# Altium schematic symbol library TI - ADC.SchLib: 2197 symbols (part 120 of 130) (continued)
## TLV1570CDWG4
designator U?
10-Bit, 1.25 MSPS ADC 8-Channel, DSP / (Q)SPI IF, Programmable Internal Reference, Auto or Software Power Down, Very Low Power, 0 to 70 degC, 20-pin SOIC (DW20), Green (RoHS & no Sb/Br); Manufacturer: Texas Instruments; PartNumber: TLV1570CDWG4; # Input Channels: 8; Analog Voltage AV/DD(Max)(V): 5.5; Analog Voltage AV/DD(Min)(V): 2.7; Architecture: SAR; ENOB(Bits): 9.3; INL(Max)(+/-LSB): 1; Interface: Serial SPI; Resolution(Bits): 10; Sample Rate (max)(SPS): 1.25M; SFDR(dB): 63; SINAD(dB): 58; SNR(dB): 61; SubFamily: Precision ADC (<=10MSPS); DatasheetVersion: SLAS169B; PackageVersion: 4040000-4/G, 01/2011; PackageReference: DW20; PackageDescription: 20-Pin Plastic Small Outline, Body 12.8 x 7.5 mm, Pitch 1.27 mm; Supplier 1: Digi-Key; Supplier Part Number 1: ADS8331IPWR-ND; Supplier 2: Mouser; Supplier Part Number 2: 595-ADS8331IPWR; Digital Supply(Max)(V): 5.5; Digital Supply(Min)(V): 2.7; Eco-Plan: Green (RoHS & no Sb/Br); Mounting Technology: Surface Mount; Code_JEDEC: MO-013; ComponentLink1Description: Manufacturer URL; ComponentLink1URL: http://www.ti.com/; ComponentLink2Description: Datasheet; ComponentLink2URL: http://www.ti.com/general/docs/lit/getliterature.tsp?genericPartNumber=TLV1570&fileType=pdf; ComponentLink3Description: Package Specification; ComponentLink3URL: http://www.ti.com/lit/ml/mpds173a/mpds173a.pdf
footprint TI-DW20_N (SOIC, 20-Leads, Body 12.8x7.5mm, Pitch 1.27mm, IPC Medium Density)
footprint TI-DW20_L (SOIC, 20-Leads, Body 12.8x7.5mm, Pitch 1.27mm, IPC High Density)
footprint TI-DW20_M (SOIC, 20-Leads, Body 12.8x7.5mm, Pitch 1.27mm, IPC Low Density)
pins: 1 CH4 (in) "Analog input channels 0 - 7", 2 CH3 (in) "Analog input channels 0 - 7", 3 CH2 (in) "Analog input channels 0 - 7", 4 CH1 (in) "Analog input channels 0 - 7", 5 CH0 (in) "Analog input channels 0 - 7", 6 DVDD (power) "Digital supply voltage, 2.7 V to 5.5 V", 7 DGND (power) "Digital ground", 8 FS (in) "Frame sync. The falling edge of the frame sync pulse from a DSP indicates the start of a serial data frame shifted out of the TLV1570. FS is pulled high when interfaced to a microcontroller.", 9 SCLK (in) "Serial clock input. SCLK synchronizes the serial data transfer and is also used for internal data conversion.", 10 SDIN (in) "Serial data input used to configure the internal control register.", 11 SDOUT (out) "Serial data output. A/D conversion results are output at SDOUT.", 12 ~{CS} (in) "Chip select. A low level signal on C\S\ enables the TLV1570. A high level signal on C\S\ disables the device and disconnects power to the TLV1570.", 13 REF (in) "Reference voltage input. The voltage applied to REF defines the input span of the TLV1570. In external reference mode, a 0.1 uF decoupling capacitor must be placed between the reference and AGND. This is not required for (See Datasheet)", 14 AGND (power) "Analog ground", 15 AVDD (power) "Analog supply voltage, 2.7 V to 5.5 V", 16 CH7 (in) "Analog input channels 0 - 7", 17 CH6 (in) "Analog input channels 0 - 7", 18 CH5 (in) "Analog input channels 0 - 7", 19 MO (out) "On-chip MUX analog output", 20 AIN (in) "ADC analog input"

## TLV1570CDWR
designator U?
10-Bit, 1.25 MSPS ADC 8-Channel, DSP / (Q)SPI IF, Programmable Internal Reference, Auto or Software Power Down, Very Low Power, 0 to 70 degC, 20-pin SOIC (DW20), Green (RoHS & no Sb/Br); Manufacturer: Texas Instruments; PartNumber: TLV1570CDWR; # Input Channels: 8; Analog Voltage AV/DD(Max)(V): 5.5; Analog Voltage AV/DD(Min)(V): 2.7; Architecture: SAR; ENOB(Bits): 9.3; INL(Max)(+/-LSB): 1; Interface: Serial SPI; Resolution(Bits): 10; Sample Rate (max)(SPS): 1.25M; SFDR(dB): 63; SINAD(dB): 58; SNR(dB): 61; SubFamily: Precision ADC (<=10MSPS); DatasheetVersion: SLAS169B; PackageVersion: 4040000-4/G, 01/2011; PackageReference: DW20; PackageDescription: 20-Pin Plastic Small Outline, Body 12.8 x 7.5 mm, Pitch 1.27 mm; Supplier 1: Digi-Key; Supplier Part Number 1: 296-25861-2-ND; Supplier 2: Digi-Key; Supplier Part Number 2: 296-25861-1-ND; Supplier 3: Digi-Key; Supplier Part Number 3: 296-25861-6-ND; Supplier 4: Mouser; Supplier Part Number 4: 595-ADS8331IRGER; Digital Supply(Max)(V): 5.5; Digital Supply(Min)(V): 2.7; Eco-Plan: Green (RoHS & no Sb/Br); Mounting Technology: Surface Mount; Code_JEDEC: MO-013; ComponentLink1Description: Manufacturer URL; ComponentLink1URL: http://www.ti.com/; ComponentLink2Description: Datasheet; ComponentLink2URL: http://www.ti.com/general/docs/lit/getliterature.tsp?genericPartNumber=TLV1570&fileType=pdf; ComponentLink3Description: Package Specification; ComponentLink3URL: http://www.ti.com/lit/ml/mpds173a/mpds173a.pdf
footprint TI-DW20_N (SOIC, 20-Leads, Body 12.8x7.5mm, Pitch 1.27mm, IPC Medium Density)
footprint TI-DW20_L (SOIC, 20-Leads, Body 12.8x7.5mm, Pitch 1.27mm, IPC High Density)
footprint TI-DW20_M (SOIC, 20-Leads, Body 12.8x7.5mm, Pitch 1.27mm, IPC Low Density)
pins: 1 CH4 (in) "Analog input channels 0 - 7", 2 CH3 (in) "Analog input channels 0 - 7", 3 CH2 (in) "Analog input channels 0 - 7", 4 CH1 (in) "Analog input channels 0 - 7", 5 CH0 (in) "Analog input channels 0 - 7", 6 DVDD (power) "Digital supply voltage, 2.7 V to 5.5 V", 7 DGND (power) "Digital ground", 8 FS (in) "Frame sync. The falling edge of the frame sync pulse from a DSP indicates the start of a serial data frame shifted out of the TLV1570. FS is pulled high when interfaced to a microcontroller.", 9 SCLK (in) "Serial clock input. SCLK synchronizes the serial data transfer and is also used for internal data conversion.", 10 SDIN (in) "Serial data input used to configure the internal control register.", 11 SDOUT (out) "Serial data output. A/D conversion results are output at SDOUT.", 12 ~{CS} (in) "Chip select. A low level signal on C\S\ enables the TLV1570. A high level signal on C\S\ disables the device and disconnects power to the TLV1570.", 13 REF (in) "Reference voltage input. The voltage applied to REF defines the input span of the TLV1570. In external reference mode, a 0.1 uF decoupling capacitor must be placed between the reference and AGND. This is not required for (See Datasheet)", 14 AGND (power) "Analog ground", 15 AVDD (power) "Analog supply voltage, 2.7 V to 5.5 V", 16 CH7 (in) "Analog input channels 0 - 7", 17 CH6 (in) "Analog input channels 0 - 7", 18 CH5 (in) "Analog input channels 0 - 7", 19 MO (out) "On-chip MUX analog output", 20 AIN (in) "ADC analog input"

## TLV1570CDWRG4
designator U?
10-Bit, 1.25 MSPS ADC 8-Channel, DSP / (Q)SPI IF, Programmable Internal Reference, Auto or Software Power Down, Very Low Power, 0 to 70 degC, 20-pin SOIC (DW20), Green (RoHS & no Sb/Br); Manufacturer: Texas Instruments; PartNumber: TLV1570CDWRG4; # Input Channels: 8; Analog Voltage AV/DD(Max)(V): 5.5; Analog Voltage AV/DD(Min)(V): 2.7; Architecture: SAR; ENOB(Bits): 9.3; INL(Max)(+/-LSB): 1; Interface: Serial SPI; Resolution(Bits): 10; Sample Rate (max)(SPS): 1.25M; SFDR(dB): 63; SINAD(dB): 58; SNR(dB): 61; SubFamily: Precision ADC (<=10MSPS); DatasheetVersion: SLAS169B; PackageVersion: 4040000-4/G, 01/2011; PackageReference: DW20; PackageDescription: 20-Pin Plastic Small Outline, Body 12.8 x 7.5 mm, Pitch 1.27 mm; Supplier 1: Digi-Key; Supplier Part Number 1: 296-25862-2-ND; Supplier 2: Digi-Key; Supplier Part Number 2: 296-25862-1-ND; Supplier 3: Digi-Key; Supplier Part Number 3: 296-25862-6-ND; Supplier 4: Farnell; Supplier Part Number 4: 1815712; Supplier 5: Newark; Supplier Part Number 5: 67R1111; Supplier 6: Mouser; Supplier Part Number 6: 595-ADS8331IRGET; Digital Supply(Max)(V): 5.5; Digital Supply(Min)(V): 2.7; Eco-Plan: Green (RoHS & no Sb/Br); Mounting Technology: Surface Mount; Code_JEDEC: MO-013; ComponentLink1Description: Manufacturer URL; ComponentLink1URL: http://www.ti.com/; ComponentLink2Description: Datasheet; ComponentLink2URL: http://www.ti.com/general/docs/lit/getliterature.tsp?genericPartNumber=TLV1570&fileType=pdf; ComponentLink3Description: Package Specification; ComponentLink3URL: http://www.ti.com/lit/ml/mpds173a/mpds173a.pdf
footprint TI-DW20_N (SOIC, 20-Leads, Body 12.8x7.5mm, Pitch 1.27mm, IPC Medium Density)
footprint TI-DW20_L (SOIC, 20-Leads, Body 12.8x7.5mm, Pitch 1.27mm, IPC High Density)
footprint TI-DW20_M (SOIC, 20-Leads, Body 12.8x7.5mm, Pitch 1.27mm, IPC Low Density)
pins: 1 CH4 (in) "Analog input channels 0 - 7", 2 CH3 (in) "Analog input channels 0 - 7", 3 CH2 (in) "Analog input channels 0 - 7", 4 CH1 (in) "Analog input channels 0 - 7", 5 CH0 (in) "Analog input channels 0 - 7", 6 DVDD (power) "Digital supply voltage, 2.7 V to 5.5 V", 7 DGND (power) "Digital ground", 8 FS (in) "Frame sync. The falling edge of the frame sync pulse from a DSP indicates the start of a serial data frame shifted out of the TLV1570. FS is pulled high when interfaced to a microcontroller.", 9 SCLK (in) "Serial clock input. SCLK synchronizes the serial data transfer and is also used for internal data conversion.", 10 SDIN (in) "Serial data input used to configure the internal control register.", 11 SDOUT (out) "Serial data output. A/D conversion results are output at SDOUT.", 12 ~{CS} (in) "Chip select. A low level signal on C\S\ enables the TLV1570. A high level signal on C\S\ disables the device and disconnects power to the TLV1570.", 13 REF (in) "Reference voltage input. The voltage applied to REF defines the input span of the TLV1570. In external reference mode, a 0.1 uF decoupling capacitor must be placed between the reference and AGND. This is not required for (See Datasheet)", 14 AGND (power) "Analog ground", 15 AVDD (power) "Analog supply voltage, 2.7 V to 5.5 V", 16 CH7 (in) "Analog input channels 0 - 7", 17 CH6 (in) "Analog input channels 0 - 7", 18 CH5 (in) "Analog input channels 0 - 7", 19 MO (out) "On-chip MUX analog output", 20 AIN (in) "ADC analog input"

## TLV1570CPW
designator U?
10-Bit, 1.25 MSPS ADC 8-Channel, DSP / (Q)SPI IF, Programmable Internal Reference, Auto or Software Power Down, Very Low Power, 0 to 70 degC, 20-pin SOP (PW20), Green (RoHS & no Sb/Br); Manufacturer: Texas Instruments; PartNumber: TLV1570CPW; # Input Channels: 8; Analog Voltage AV/DD(Max)(V): 5.5; Analog Voltage AV/DD(Min)(V): 2.7; Architecture: SAR; ENOB(Bits): 9.3; INL(Max)(+/-LSB): 1; Interface: Serial SPI; Resolution(Bits): 10; Sample Rate (max)(SPS): 1.25M; SFDR(dB): 63; SINAD(dB): 58; SNR(dB): 61; SubFamily: Precision ADC (<=10MSPS); DatasheetVersion: SLAS169B; PackageVersion: 4040064-5/G, 02/2011; PackageReference: PW20; PackageDescription: 20-Pin Plastic Small Outline, Body 6.5 x 4.4 mm, Pitch 0.65 mm; Supplier 1: Digi-Key; Supplier Part Number 1: ADS7263SRHBR-ND; Supplier 2: Mouser; Supplier Part Number 2: 595-ADS7263SRHBR; Digital Supply(Max)(V): 5.5; Digital Supply(Min)(V): 2.7; Eco-Plan: Green (RoHS & no Sb/Br); Mounting Technology: Surface Mount; Code_JEDEC: MO-153; ComponentLink1Description: Manufacturer URL; ComponentLink1URL: http://www.ti.com/; ComponentLink2Description: Datasheet; ComponentLink2URL: http://www.ti.com/general/docs/lit/getliterature.tsp?genericPartNumber=TLV1570&fileType=pdf; ComponentLink3Description: Package Specification; ComponentLink3URL: http://www.ti.com.cn/cn/lit/ml/mpds362/mpds362.pdf
footprint TI-PW20_N (SOP, 20-Leads, Body 6.5x4.4mm, Pitch 0.65mm, IPC Medium Density)
footprint TI-PW20_L (SOP, 20-Leads, Body 6.5x4.4mm, Pitch 0.65mm, IPC High Density)
footprint TI-PW20_M (SOP, 20-Leads, Body 6.5x4.4mm, Pitch 0.65mm, IPC Low Density)
pins: 1 CH4 (in) "Analog input channels 0 - 7", 2 CH3 (in) "Analog input channels 0 - 7", 3 CH2 (in) "Analog input channels 0 - 7", 4 CH1 (in) "Analog input channels 0 - 7", 5 CH0 (in) "Analog input channels 0 - 7", 6 DVDD (power) "Digital supply voltage, 2.7 V to 5.5 V", 7 DGND (power) "Digital ground", 8 FS (in) "Frame sync. The falling edge of the frame sync pulse from a DSP indicates the start of a serial data frame shifted out of the TLV1570. FS is pulled high when interfaced to a microcontroller.", 9 SCLK (in) "Serial clock input. SCLK synchronizes the serial data transfer and is also used for internal data conversion.", 10 SDIN (in) "Serial data input used to configure the internal control register.", 11 SDOUT (out) "Serial data output. A/D conversion results are output at SDOUT.", 12 ~{CS} (in) "Chip select. A low level signal on C\S\ enables the TLV1570. A high level signal on C\S\ disables the device and disconnects power to the TLV1570.", 13 REF (in) "Reference voltage input. The voltage applied to REF defines the input span of the TLV1570. In external reference mode, a 0.1 uF decoupling capacitor must be placed between the reference and AGND. This is not required for (See Datasheet)", 14 AGND (power) "Analog ground", 15 AVDD (power) "Analog supply voltage, 2.7 V to 5.5 V", 16 CH7 (in) "Analog input channels 0 - 7", 17 CH6 (in) "Analog input channels 0 - 7", 18 CH5 (in) "Analog input channels 0 - 7", 19 MO (out) "On-chip MUX analog output", 20 AIN (in) "ADC analog input"

## TLV1570CPWG4
designator U?
10-Bit, 1.25 MSPS ADC 8-Channel, DSP / (Q)SPI IF, Programmable Internal Reference, Auto or Software Power Down, Very Low Power, 0 to 70 degC, 20-pin SOP (PW20), Green (RoHS & no Sb/Br); Manufacturer: Texas Instruments; PartNumber: TLV1570CPWG4; # Input Channels: 8; Analog Voltage AV/DD(Max)(V): 5.5; Analog Voltage AV/DD(Min)(V): 2.7; Architecture: SAR; ENOB(Bits): 9.3; INL(Max)(+/-LSB): 1; Interface: Serial SPI; Resolution(Bits): 10; Sample Rate (max)(SPS): 1.25M; SFDR(dB): 63; SINAD(dB): 58; SNR(dB): 61; SubFamily: Precision ADC (<=10MSPS); DatasheetVersion: SLAS169B; PackageVersion: 4040064-5/G, 02/2011; PackageReference: PW20; PackageDescription: 20-Pin Plastic Small Outline, Body 6.5 x 4.4 mm, Pitch 0.65 mm; Supplier 1: Digi-Key; Supplier Part Number 1: 296-28187-2-ND; Supplier 2: Digi-Key; Supplier Part Number 2: 296-28187-1-ND; Supplier 3: Digi-Key; Supplier Part Number 3: 296-28187-6-ND; Supplier 4: Farnell; Supplier Part Number 4: 1864809; Supplier 5: Newark; Supplier Part Number 5: 25T0986; Supplier 6: Mouser; Supplier Part Number 6: 595-ADS7263SRHBT; Digital Supply(Max)(V): 5.5; Digital Supply(Min)(V): 2.7; Eco-Plan: Green (RoHS & no Sb/Br); Mounting Technology: Surface Mount; Code_JEDEC: MO-153; ComponentLink1Description: Manufacturer URL; ComponentLink1URL: http://www.ti.com/; ComponentLink2Description: Datasheet; ComponentLink2URL: http://www.ti.com/general/docs/lit/getliterature.tsp?genericPartNumber=TLV1570&fileType=pdf; ComponentLink3Description: Package Specification; ComponentLink3URL: http://www.ti.com.cn/cn/lit/ml/mpds362/mpds362.pdf
footprint TI-PW20_N (SOP, 20-Leads, Body 6.5x4.4mm, Pitch 0.65mm, IPC Medium Density)
footprint TI-PW20_L (SOP, 20-Leads, Body 6.5x4.4mm, Pitch 0.65mm, IPC High Density)
footprint TI-PW20_M (SOP, 20-Leads, Body 6.5x4.4mm, Pitch 0.65mm, IPC Low Density)
pins: 1 CH4 (in) "Analog input channels 0 - 7", 2 CH3 (in) "Analog input channels 0 - 7", 3 CH2 (in) "Analog input channels 0 - 7", 4 CH1 (in) "Analog input channels 0 - 7", 5 CH0 (in) "Analog input channels 0 - 7", 6 DVDD (power) "Digital supply voltage, 2.7 V to 5.5 V", 7 DGND (power) "Digital ground", 8 FS (in) "Frame sync. The falling edge of the frame sync pulse from a DSP indicates the start of a serial data frame shifted out of the TLV1570. FS is pulled high when interfaced to a microcontroller.", 9 SCLK (in) "Serial clock input. SCLK synchronizes the serial data transfer and is also used for internal data conversion.", 10 SDIN (in) "Serial data input used to configure the internal control register.", 11 SDOUT (out) "Serial data output. A/D conversion results are output at SDOUT.", 12 ~{CS} (in) "Chip select. A low level signal on C\S\ enables the TLV1570. A high level signal on C\S\ disables the device and disconnects power to the TLV1570.", 13 REF (in) "Reference voltage input. The voltage applied to REF defines the input span of the TLV1570. In external reference mode, a 0.1 uF decoupling capacitor must be placed between the reference and AGND. This is not required for (See Datasheet)", 14 AGND (power) "Analog ground", 15 AVDD (power) "Analog supply voltage, 2.7 V to 5.5 V", 16 CH7 (in) "Analog input channels 0 - 7", 17 CH6 (in) "Analog input channels 0 - 7", 18 CH5 (in) "Analog input channels 0 - 7", 19 MO (out) "On-chip MUX analog output", 20 AIN (in) "ADC analog input"

## TLV1570CPWR
designator U?
10-Bit, 1.25 MSPS ADC 8-Channel, DSP / (Q)SPI IF, Programmable Internal Reference, Auto or Software Power Down, Very Low Power, 0 to 70 degC, 20-pin SOP (PW20), Green (RoHS & no Sb/Br); Manufacturer: Texas Instruments; PartNumber: TLV1570CPWR; # Input Channels: 8; Analog Voltage AV/DD(Max)(V): 5.5; Analog Voltage AV/DD(Min)(V): 2.7; Architecture: SAR; ENOB(Bits): 9.3; INL(Max)(+/-LSB): 1; Interface: Serial SPI; Resolution(Bits): 10; Sample Rate (max)(SPS): 1.25M; SFDR(dB): 63; SINAD(dB): 58; SNR(dB): 61; SubFamily: Precision ADC (<=10MSPS); DatasheetVersion: SLAS169B; PackageVersion: 4040064-5/G, 02/2011; PackageReference: PW20; PackageDescription: 20-Pin Plastic Small Outline, Body 6.5 x 4.4 mm, Pitch 0.65 mm; Supplier 1: Digi-Key; Supplier Part Number 1: 296-28267-5-ND; Supplier 2: Farnell; Supplier Part Number 2: 1882256; Supplier 3: Newark; Supplier Part Number 3: 27T6167; Supplier 4: Mouser; Supplier Part Number 4: 595-ADS8332IBPW; Digital Supply(Max)(V): 5.5; Digital Supply(Min)(V): 2.7; Eco-Plan: Green (RoHS & no Sb/Br); Mounting Technology: Surface Mount; Code_JEDEC: MO-153; ComponentLink1Description: Manufacturer URL; ComponentLink1URL: http://www.ti.com/; ComponentLink2Description: Datasheet; ComponentLink2URL: http://www.ti.com/general/docs/lit/getliterature.tsp?genericPartNumber=TLV1570&fileType=pdf; ComponentLink3Description: Package Specification; ComponentLink3URL: http://www.ti.com.cn/cn/lit/ml/mpds362/mpds362.pdf
footprint TI-PW20_N (SOP, 20-Leads, Body 6.5x4.4mm, Pitch 0.65mm, IPC Medium Density)
footprint TI-PW20_L (SOP, 20-Leads, Body 6.5x4.4mm, Pitch 0.65mm, IPC High Density)
footprint TI-PW20_M (SOP, 20-Leads, Body 6.5x4.4mm, Pitch 0.65mm, IPC Low Density)
pins: 1 CH4 (in) "Analog input channels 0 - 7", 2 CH3 (in) "Analog input channels 0 - 7", 3 CH2 (in) "Analog input channels 0 - 7", 4 CH1 (in) "Analog input channels 0 - 7", 5 CH0 (in) "Analog input channels 0 - 7", 6 DVDD (power) "Digital supply voltage, 2.7 V to 5.5 V", 7 DGND (power) "Digital ground", 8 FS (in) "Frame sync. The falling edge of the frame sync pulse from a DSP indicates the start of a serial data frame shifted out of the TLV1570. FS is pulled high when interfaced to a microcontroller.", 9 SCLK (in) "Serial clock input. SCLK synchronizes the serial data transfer and is also used for internal data conversion.", 10 SDIN (in) "Serial data input used to configure the internal control register.", 11 SDOUT (out) "Serial data output. A/D conversion results are output at SDOUT.", 12 ~{CS} (in) "Chip select. A low level signal on C\S\ enables the TLV1570. A high level signal on C\S\ disables the device and disconnects power to the TLV1570.", 13 REF (in) "Reference voltage input. The voltage applied to REF defines the input span of the TLV1570. In external reference mode, a 0.1 uF decoupling capacitor must be placed between the reference and AGND. This is not required for (See Datasheet)", 14 AGND (power) "Analog ground", 15 AVDD (power) "Analog supply voltage, 2.7 V to 5.5 V", 16 CH7 (in) "Analog input channels 0 - 7", 17 CH6 (in) "Analog input channels 0 - 7", 18 CH5 (in) "Analog input channels 0 - 7", 19 MO (out) "On-chip MUX analog output", 20 AIN (in) "ADC analog input"

## TLV1570CPWRG4
designator U?
10-Bit, 1.25 MSPS ADC 8-Channel, DSP / (Q)SPI IF, Programmable Internal Reference, Auto or Software Power Down, Very Low Power, 0 to 70 degC, 20-pin SOP (PW20), Green (RoHS & no Sb/Br); Manufacturer: Texas Instruments; PartNumber: TLV1570CPWRG4; # Input Channels: 8; Analog Voltage AV/DD(Max)(V): 5.5; Analog Voltage AV/DD(Min)(V): 2.7; Architecture: SAR; ENOB(Bits): 9.3; INL(Max)(+/-LSB): 1; Interface: Serial SPI; Resolution(Bits): 10; Sample Rate (max)(SPS): 1.25M; SFDR(dB): 63; SINAD(dB): 58; SNR(dB): 61; SubFamily: Precision ADC (<=10MSPS); DatasheetVersion: SLAS169B; PackageVersion: 4040064-5/G, 02/2011; PackageReference: PW20; PackageDescription: 20-Pin Plastic Small Outline, Body 6.5 x 4.4 mm, Pitch 0.65 mm; Supplier 1: Digi-Key; Supplier Part Number 1: ADS8332IBPWR-ND; Supplier 2: Newark; Supplier Part Number 2: 27T6168; Supplier 3: Mouser; Supplier Part Number 3: 595-ADS8332IBPWR; Digital Supply(Max)(V): 5.5; Digital Supply(Min)(V): 2.7; Eco-Plan: Green (RoHS & no Sb/Br); Mounting Technology: Surface Mount; Code_JEDEC: MO-153; ComponentLink1Description: Manufacturer URL; ComponentLink1URL: http://www.ti.com/; ComponentLink2Description: Datasheet; ComponentLink2URL: http://www.ti.com/general/docs/lit/getliterature.tsp?genericPartNumber=TLV1570&fileType=pdf; ComponentLink3Description: Package Specification; ComponentLink3URL: http://www.ti.com.cn/cn/lit/ml/mpds362/mpds362.pdf
footprint TI-PW20_N (SOP, 20-Leads, Body 6.5x4.4mm, Pitch 0.65mm, IPC Medium Density)
footprint TI-PW20_L (SOP, 20-Leads, Body 6.5x4.4mm, Pitch 0.65mm, IPC High Density)
footprint TI-PW20_M (SOP, 20-Leads, Body 6.5x4.4mm, Pitch 0.65mm, IPC Low Density)
pins: 1 CH4 (in) "Analog input channels 0 - 7", 2 CH3 (in) "Analog input channels 0 - 7", 3 CH2 (in) "Analog input channels 0 - 7", 4 CH1 (in) "Analog input channels 0 - 7", 5 CH0 (in) "Analog input channels 0 - 7", 6 DVDD (power) "Digital supply voltage, 2.7 V to 5.5 V", 7 DGND (power) "Digital ground", 8 FS (in) "Frame sync. The falling edge of the frame sync pulse from a DSP indicates the start of a serial data frame shifted out of the TLV1570. FS is pulled high when interfaced to a microcontroller.", 9 SCLK (in) "Serial clock input. SCLK synchronizes the serial data transfer and is also used for internal data conversion.", 10 SDIN (in) "Serial data input used to configure the internal control register.", 11 SDOUT (out) "Serial data output. A/D conversion results are output at SDOUT.", 12 ~{CS} (in) "Chip select. A low level signal on C\S\ enables the TLV1570. A high level signal on C\S\ disables the device and disconnects power to the TLV1570.", 13 REF (in) "Reference voltage input. The voltage applied to REF defines the input span of the TLV1570. In external reference mode, a 0.1 uF decoupling capacitor must be placed between the reference and AGND. This is not required for (See Datasheet)", 14 AGND (power) "Analog ground", 15 AVDD (power) "Analog supply voltage, 2.7 V to 5.5 V", 16 CH7 (in) "Analog input channels 0 - 7", 17 CH6 (in) "Analog input channels 0 - 7", 18 CH5 (in) "Analog input channels 0 - 7", 19 MO (out) "On-chip MUX analog output", 20 AIN (in) "ADC analog input"

## TLV1570IDW
designator U?
10-Bit, 1.25 MSPS ADC 8-Channel, DSP / (Q)SPI IF, Programmable Internal Reference, Auto or Software Power Down, Very Low Power, -40 to 85 degC, 20-pin SOIC (DW20), Green (RoHS & no Sb/Br); Manufacturer: Texas Instruments; PartNumber: TLV1570IDW; # Input Channels: 8; Analog Voltage AV/DD(Max)(V): 5.5; Analog Voltage AV/DD(Min)(V): 2.7; Architecture: SAR; ENOB(Bits): 9.3; INL(Max)(+/-LSB): 1; Interface: Serial SPI; Resolution(Bits): 10; Sample Rate (max)(SPS): 1.25M; SFDR(dB): 63; SINAD(dB): 58; SNR(dB): 61; SubFamily: Precision ADC (<=10MSPS); DatasheetVersion: SLAS169B; PackageVersion: 4040000-4/G, 01/2011; PackageReference: DW20; PackageDescription: 20-Pin Plastic Small Outline, Body 12.8 x 7.5 mm, Pitch 1.27 mm; Supplier 1: Digi-Key; Supplier Part Number 1: ADS8332IBRGER-ND; Supplier 2: Mouser; Supplier Part Number 2: 595-ADS8332IBRGER; Digital Supply(Max)(V): 5.5; Digital Supply(Min)(V): 2.7; Eco-Plan: Green (RoHS & no Sb/Br); Mounting Technology: Surface Mount; Code_JEDEC: MO-013; ComponentLink1Description: Manufacturer URL; ComponentLink1URL: http://www.ti.com/; ComponentLink2Description: Datasheet; ComponentLink2URL: http://www.ti.com/general/docs/lit/getliterature.tsp?genericPartNumber=TLV1570&fileType=pdf; ComponentLink3Description: Package Specification; ComponentLink3URL: http://www.ti.com/lit/ml/mpds173a/mpds173a.pdf
footprint TI-DW20_N (SOIC, 20-Leads, Body 12.8x7.5mm, Pitch 1.27mm, IPC Medium Density)
footprint TI-DW20_L (SOIC, 20-Leads, Body 12.8x7.5mm, Pitch 1.27mm, IPC High Density)
footprint TI-DW20_M (SOIC, 20-Leads, Body 12.8x7.5mm, Pitch 1.27mm, IPC Low Density)
pins: 1 CH4 (in) "Analog input channels 0 - 7", 2 CH3 (in) "Analog input channels 0 - 7", 3 CH2 (in) "Analog input channels 0 - 7", 4 CH1 (in) "Analog input channels 0 - 7", 5 CH0 (in) "Analog input channels 0 - 7", 6 DVDD (power) "Digital supply voltage, 2.7 V to 5.5 V", 7 DGND (power) "Digital ground", 8 FS (in) "Frame sync. The falling edge of the frame sync pulse from a DSP indicates the start of a serial data frame shifted out of the TLV1570. FS is pulled high when interfaced to a microcontroller.", 9 SCLK (in) "Serial clock input. SCLK synchronizes the serial data transfer and is also used for internal data conversion.", 10 SDIN (in) "Serial data input used to configure the internal control register.", 11 SDOUT (out) "Serial data output. A/D conversion results are output at SDOUT.", 12 ~{CS} (in) "Chip select. A low level signal on C\S\ enables the TLV1570. A high level signal on C\S\ disables the device and disconnects power to the TLV1570.", 13 REF (in) "Reference voltage input. The voltage applied to REF defines the input span of the TLV1570. In external reference mode, a 0.1 uF decoupling capacitor must be placed between the reference and AGND. This is not required for (See Datasheet)", 14 AGND (power) "Analog ground", 15 AVDD (power) "Analog supply voltage, 2.7 V to 5.5 V", 16 CH7 (in) "Analog input channels 0 - 7", 17 CH6 (in) "Analog input channels 0 - 7", 18 CH5 (in) "Analog input channels 0 - 7", 19 MO (out) "On-chip MUX analog output", 20 AIN (in) "ADC analog input"

## TLV1570IDWG4
designator U?
10-Bit, 1.25 MSPS ADC 8-Channel, DSP / (Q)SPI IF, Programmable Internal Reference, Auto or Software Power Down, Very Low Power, -40 to 85 degC, 20-pin SOIC (DW20), Green (RoHS & no Sb/Br); Manufacturer: Texas Instruments; PartNumber: TLV1570IDWG4; # Input Channels: 8; Analog Voltage AV/DD(Max)(V): 5.5; Analog Voltage AV/DD(Min)(V): 2.7; Architecture: SAR; ENOB(Bits): 9.3; INL(Max)(+/-LSB): 1; Interface: Serial SPI; Resolution(Bits): 10; Sample Rate (max)(SPS): 1.25M; SFDR(dB): 63; SINAD(dB): 58; SNR(dB): 61; SubFamily: Precision ADC (<=10MSPS); DatasheetVersion: SLAS169B; PackageVersion: 4040000-4/G, 01/2011; PackageReference: DW20; PackageDescription: 20-Pin Plastic Small Outline, Body 12.8 x 7.5 mm, Pitch 1.27 mm; Supplier 1: Digi-Key; Supplier Part Number 1: 296-25651-2-ND; Supplier 2: Digi-Key; Supplier Part Number 2: 296-25651-1-ND; Supplier 3: Digi-Key; Supplier Part Number 3: 296-25651-6-ND; Supplier 4: Farnell; Supplier Part Number 4: 1863091; Supplier 5: Newark; Supplier Part Number 5: 39T3994; Supplier 6: Newark; Supplier Part Number 6: 61R9354; Supplier 7: Mouser; Supplier Part Number 7: 595-ADS8332IBRGET; Digital Supply(Max)(V): 5.5; Digital Supply(Min)(V): 2.7; Eco-Plan: Green (RoHS & no Sb/Br); Mounting Technology: Surface Mount; Code_JEDEC: MO-013; ComponentLink1Description: Manufacturer URL; ComponentLink1URL: http://www.ti.com/; ComponentLink2Description: Datasheet; ComponentLink2URL: http://www.ti.com/general/docs/lit/getliterature.tsp?genericPartNumber=TLV1570&fileType=pdf; ComponentLink3Description: Package Specification; ComponentLink3URL: http://www.ti.com/lit/ml/mpds173a/mpds173a.pdf
footprint TI-DW20_N (SOIC, 20-Leads, Body 12.8x7.5mm, Pitch 1.27mm, IPC Medium Density)
footprint TI-DW20_L (SOIC, 20-Leads, Body 12.8x7.5mm, Pitch 1.27mm, IPC High Density)
footprint TI-DW20_M (SOIC, 20-Leads, Body 12.8x7.5mm, Pitch 1.27mm, IPC Low Density)
pins: 1 CH4 (in) "Analog input channels 0 - 7", 2 CH3 (in) "Analog input channels 0 - 7", 3 CH2 (in) "Analog input channels 0 - 7", 4 CH1 (in) "Analog input channels 0 - 7", 5 CH0 (in) "Analog input channels 0 - 7", 6 DVDD (power) "Digital supply voltage, 2.7 V to 5.5 V", 7 DGND (power) "Digital ground", 8 FS (in) "Frame sync. The falling edge of the frame sync pulse from a DSP indicates the start of a serial data frame shifted out of the TLV1570. FS is pulled high when interfaced to a microcontroller.", 9 SCLK (in) "Serial clock input. SCLK synchronizes the serial data transfer and is also used for internal data conversion.", 10 SDIN (in) "Serial data input used to configure the internal control register.", 11 SDOUT (out) "Serial data output. A/D conversion results are output at SDOUT.", 12 ~{CS} (in) "Chip select. A low level signal on C\S\ enables the TLV1570. A high level signal on C\S\ disables the device and disconnects power to the TLV1570.", 13 REF (in) "Reference voltage input. The voltage applied to REF defines the input span of the TLV1570. In external reference mode, a 0.1 uF decoupling capacitor must be placed between the reference and AGND. This is not required for (See Datasheet)", 14 AGND (power) "Analog ground", 15 AVDD (power) "Analog supply voltage, 2.7 V to 5.5 V", 16 CH7 (in) "Analog input channels 0 - 7", 17 CH6 (in) "Analog input channels 0 - 7", 18 CH5 (in) "Analog input channels 0 - 7", 19 MO (out) "On-chip MUX analog output", 20 AIN (in) "ADC analog input"

## TLV1570IPW
designator U?
10-Bit, 1.25 MSPS ADC 8-Channel, DSP / (Q)SPI IF, Programmable Internal Reference, Auto or Software Power Down, Very Low Power, -40 to 85 degC, 20-pin SOP (PW20), Green (RoHS & no Sb/Br); Manufacturer: Texas Instruments; PartNumber: TLV1570IPW; # Input Channels: 8; Analog Voltage AV/DD(Max)(V): 5.5; Analog Voltage AV/DD(Min)(V): 2.7; Architecture: SAR; ENOB(Bits): 9.3; INL(Max)(+/-LSB): 1; Interface: Serial SPI; Resolution(Bits): 10; Sample Rate (max)(SPS): 1.25M; SFDR(dB): 63; SINAD(dB): 58; SNR(dB): 61; SubFamily: Precision ADC (<=10MSPS); DatasheetVersion: SLAS169B; PackageVersion: 4040064-5/G, 02/2011; PackageReference: PW20; PackageDescription: 20-Pin Plastic Small Outline, Body 6.5 x 4.4 mm, Pitch 0.65 mm; Supplier 1: Digi-Key; Supplier Part Number 1: 296-28119-ND; Supplier 2: Farnell; Supplier Part Number 2: 1882258; Supplier 3: Newark; Supplier Part Number 3: 27T6169; Supplier 4: Mouser; Supplier Part Number 4: 595-ADS8332IPW; Digital Supply(Max)(V): 5.5; Digital Supply(Min)(V): 2.7; Eco-Plan: Green (RoHS & no Sb/Br); Mounting Technology: Surface Mount; Code_JEDEC: MO-153; ComponentLink1Description: Manufacturer URL; ComponentLink1URL: http://www.ti.com/; ComponentLink2Description: Datasheet; ComponentLink2URL: http://www.ti.com/general/docs/lit/getliterature.tsp?genericPartNumber=TLV1570&fileType=pdf; ComponentLink3Description: Package Specification; ComponentLink3URL: http://www.ti.com.cn/cn/lit/ml/mpds362/mpds362.pdf
footprint TI-PW20_N (SOP, 20-Leads, Body 6.5x4.4mm, Pitch 0.65mm, IPC Medium Density)
footprint TI-PW20_L (SOP, 20-Leads, Body 6.5x4.4mm, Pitch 0.65mm, IPC High Density)
footprint TI-PW20_M (SOP, 20-Leads, Body 6.5x4.4mm, Pitch 0.65mm, IPC Low Density)
pins: 1 CH4 (in) "Analog input channels 0 - 7", 2 CH3 (in) "Analog input channels 0 - 7", 3 CH2 (in) "Analog input channels 0 - 7", 4 CH1 (in) "Analog input channels 0 - 7", 5 CH0 (in) "Analog input channels 0 - 7", 6 DVDD (power) "Digital supply voltage, 2.7 V to 5.5 V", 7 DGND (power) "Digital ground", 8 FS (in) "Frame sync. The falling edge of the frame sync pulse from a DSP indicates the start of a serial data frame shifted out of the TLV1570. FS is pulled high when interfaced to a microcontroller.", 9 SCLK (in) "Serial clock input. SCLK synchronizes the serial data transfer and is also used for internal data conversion.", 10 SDIN (in) "Serial data input used to configure the internal control register.", 11 SDOUT (out) "Serial data output. A/D conversion results are output at SDOUT.", 12 ~{CS} (in) "Chip select. A low level signal on C\S\ enables the TLV1570. A high level signal on C\S\ disables the device and disconnects power to the TLV1570.", 13 REF (in) "Reference voltage input. The voltage applied to REF defines the input span of the TLV1570. In external reference mode, a 0.1 uF decoupling capacitor must be placed between the reference and AGND. This is not required for (See Datasheet)", 14 AGND (power) "Analog ground", 15 AVDD (power) "Analog supply voltage, 2.7 V to 5.5 V", 16 CH7 (in) "Analog input channels 0 - 7", 17 CH6 (in) "Analog input channels 0 - 7", 18 CH5 (in) "Analog input channels 0 - 7", 19 MO (out) "On-chip MUX analog output", 20 AIN (in) "ADC analog input"

## TLV1570IPWG4
designator U?
10-Bit, 1.25 MSPS ADC 8-Channel, DSP / (Q)SPI IF, Programmable Internal Reference, Auto or Software Power Down, Very Low Power, -40 to 85 degC, 20-pin SOP (PW20), Green (RoHS & no Sb/Br); Manufacturer: Texas Instruments; PartNumber: TLV1570IPWG4; # Input Channels: 8; Analog Voltage AV/DD(Max)(V): 5.5; Analog Voltage AV/DD(Min)(V): 2.7; Architecture: SAR; ENOB(Bits): 9.3; INL(Max)(+/-LSB): 1; Interface: Serial SPI; Resolution(Bits): 10; Sample Rate (max)(SPS): 1.25M; SFDR(dB): 63; SINAD(dB): 58; SNR(dB): 61; SubFamily: Precision ADC (<=10MSPS); DatasheetVersion: SLAS169B; PackageVersion: 4040064-5/G, 02/2011; PackageReference: PW20; PackageDescription: 20-Pin Plastic Small Outline, Body 6.5 x 4.4 mm, Pitch 0.65 mm; Supplier 1: Digi-Key; Supplier Part Number 1: ADS8332IPWR-ND; Supplier 2: Mouser; Supplier Part Number 2: 595-ADS8332IPWR; Digital Supply(Max)(V): 5.5; Digital Supply(Min)(V): 2.7; Eco-Plan: Green (RoHS & no Sb/Br); Mounting Technology: Surface Mount; Code_JEDEC: MO-153; ComponentLink1Description: Manufacturer URL; ComponentLink1URL: http://www.ti.com/; ComponentLink2Description: Datasheet; ComponentLink2URL: http://www.ti.com/general/docs/lit/getliterature.tsp?genericPartNumber=TLV1570&fileType=pdf; ComponentLink3Description: Package Specification; ComponentLink3URL: http://www.ti.com.cn/cn/lit/ml/mpds362/mpds362.pdf
footprint TI-PW20_N (SOP, 20-Leads, Body 6.5x4.4mm, Pitch 0.65mm, IPC Medium Density)
footprint TI-PW20_L (SOP, 20-Leads, Body 6.5x4.4mm, Pitch 0.65mm, IPC High Density)
footprint TI-PW20_M (SOP, 20-Leads, Body 6.5x4.4mm, Pitch 0.65mm, IPC Low Density)
pins: 1 CH4 (in) "Analog input channels 0 - 7", 2 CH3 (in) "Analog input channels 0 - 7", 3 CH2 (in) "Analog input channels 0 - 7", 4 CH1 (in) "Analog input channels 0 - 7", 5 CH0 (in) "Analog input channels 0 - 7", 6 DVDD (power) "Digital supply voltage, 2.7 V to 5.5 V", 7 DGND (power) "Digital ground", 8 FS (in) "Frame sync. The falling edge of the frame sync pulse from a DSP indicates the start of a serial data frame shifted out of the TLV1570. FS is pulled high when interfaced to a microcontroller.", 9 SCLK (in) "Serial clock input. SCLK synchronizes the serial data transfer and is also used for internal data conversion.", 10 SDIN (in) "Serial data input used to configure the internal control register.", 11 SDOUT (out) "Serial data output. A/D conversion results are output at SDOUT.", 12 ~{CS} (in) "Chip select. A low level signal on C\S\ enables the TLV1570. A high level signal on C\S\ disables the device and disconnects power to the TLV1570.", 13 REF (in) "Reference voltage input. The voltage applied to REF defines the input span of the TLV1570. In external reference mode, a 0.1 uF decoupling capacitor must be placed between the reference and AGND. This is not required for (See Datasheet)", 14 AGND (power) "Analog ground", 15 AVDD (power) "Analog supply voltage, 2.7 V to 5.5 V", 16 CH7 (in) "Analog input channels 0 - 7", 17 CH6 (in) "Analog input channels 0 - 7", 18 CH5 (in) "Analog input channels 0 - 7", 19 MO (out) "On-chip MUX analog output", 20 AIN (in) "ADC analog input"